# Altium footprint library PCBLIB.PcbLib: 557 footprints (part 27 of 36)
Each footprint in its own frame and in the unit in brackets; x right, y up, seen from the top. Pads: shape width x height; smd on the part's side, far side on the other; paste and mask are expansions set on the pad; w line width, h text height; cw(c..) or ccw(c..) is an arc to the next point about the centre after c.
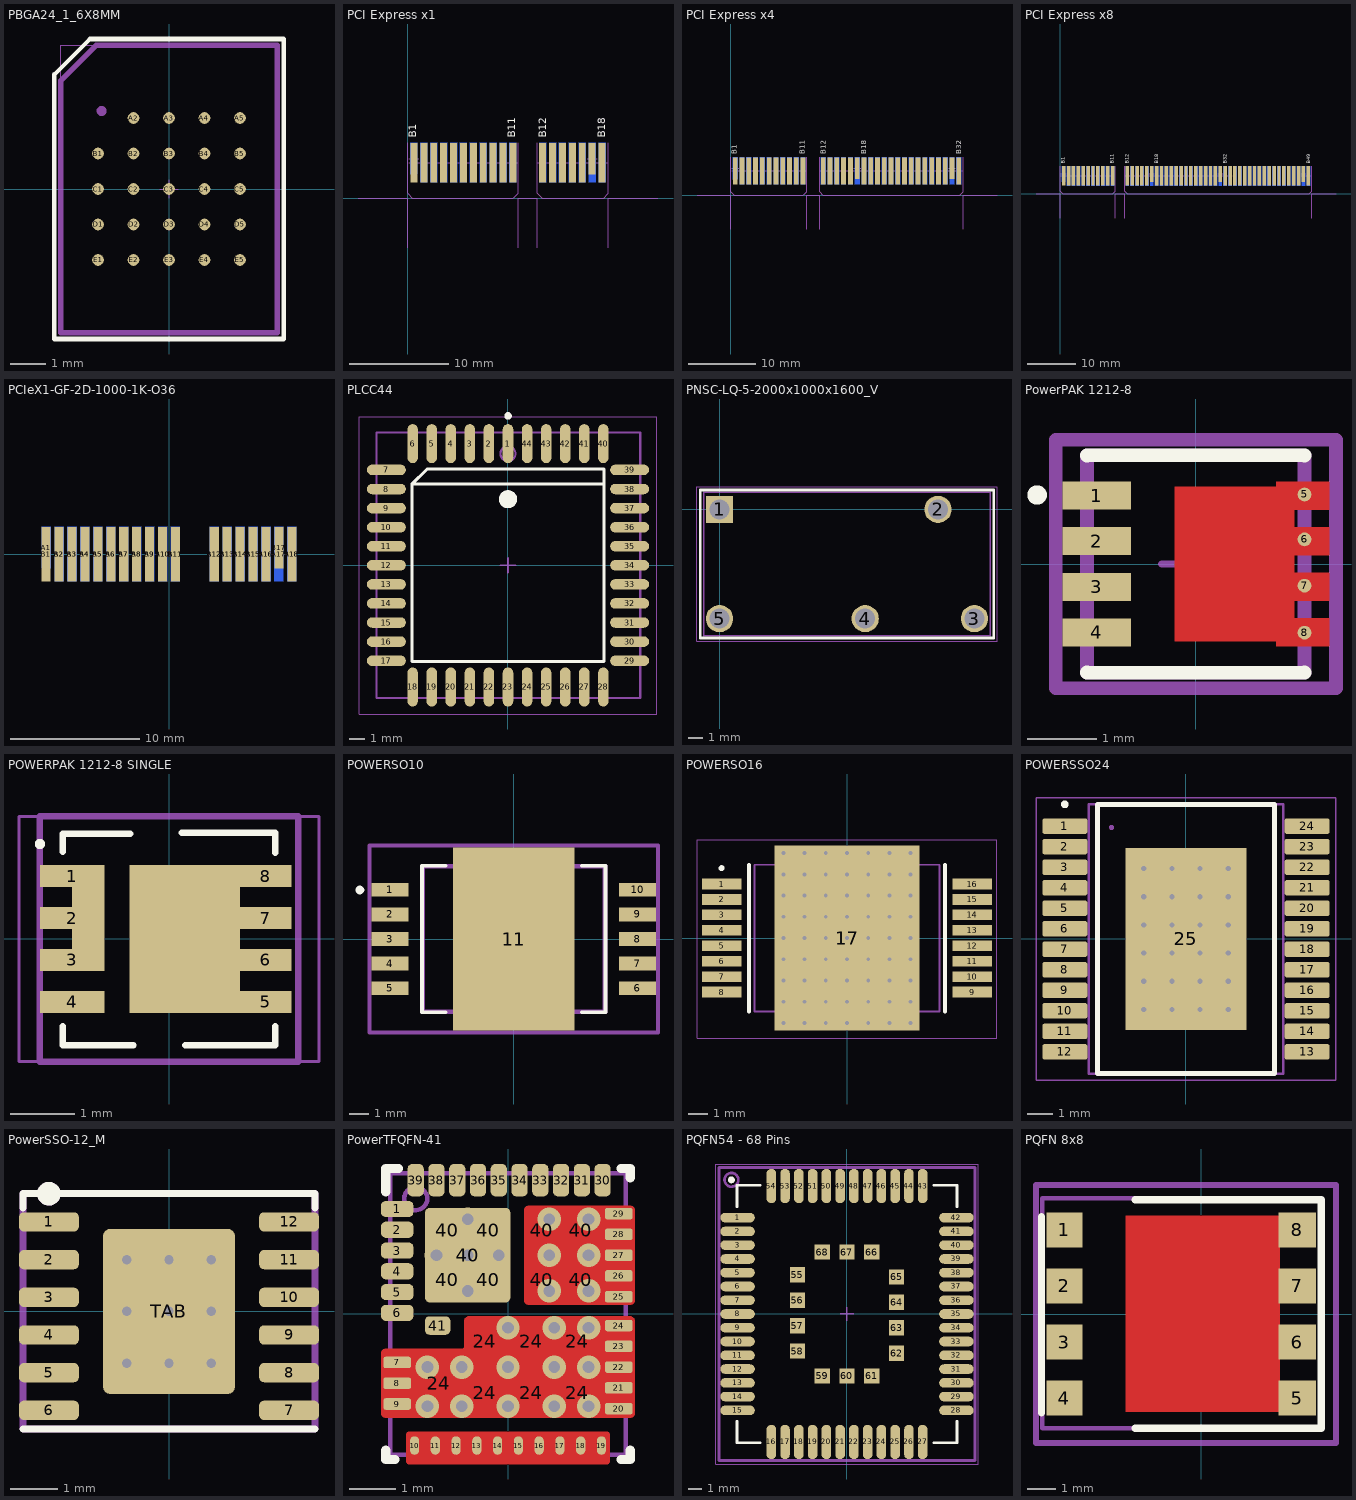
[diagram p26: the footprints below, top view; thin cyan lines are the x and y axes]

## PBGA24_1_6X8MM [mil] "PBGA24_1_6X8MM"
pads (24):
  round 13 smd: A2(-39.37,78.74) A3(0,78.74) A4(39.37,78.74) A5(78.74,78.74) B1(-78.74,39.37) B2(-39.37,39.37) B3(0,39.37) B4(39.37,39.37) B5(78.74,39.37) C1(-78.74,0) C2(-39.37,0) C3(0,0) C4(39.37,0) C5(78.74,0) D1(-78.74,-39.37) D2(-39.37,-39.37) D3(0,-39.37) D4(39.37,-39.37) D5(78.74,-39.37) E1(-78.74,-78.74) E2(-39.37,-78.74) E3(0,-78.74) E4(39.37,-78.74) E5(78.74,-78.74)
Top Overlay:
  lines w5: -127.08,-166.45 -127.08,127.08 -87.71,166.45 127.08,166.45 127.08,-166.45 -127.08,-166.45
Top 3D Body (Mech7):
  lines w1: -120.08,-159.45 120.08,-159.45 120.08,159.45 -120.08,159.45 -120.08,-159.45
Bottom 3D Body (Mech9):
  lines w1: -10,0 10,0 ; 0,-10 0,10
Mechanical 11:
  circle w6: c-74.8,86.61 r2.46
  lines w6: -120.14,-159.45 120.02,-159.45 120.02,159.45 -80.77,159.45 -120.14,120.08 -120.14,-159.45
  text ".Designator" at 32.87,11.25 h20

## PCI Express x1 [mm] "36 contacts Board Eddge PCI Express x1 Connector"
pads (36):
  rect 0.7x3.2 smd far side paste-0.4: A1(0.65,4)
  rect 0.7x4 smd far side paste-0.4: A2(1.65,3.6) A3(2.65,3.6) A4(3.65,3.6) A5(4.65,3.6) A6(5.65,3.6) A7(6.65,3.6) A8(7.65,3.6) A9(8.65,3.6) A10(9.65,3.6) A11(10.65,3.6) A12(13.65,3.6) A13(14.65,3.6) A14(15.65,3.6) A15(16.65,3.6) A16(17.65,3.6) A17(18.65,3.6) A18(19.65,3.6)
  rect 0.7x4 smd paste-0.4: B1(0.65,3.6) B2(1.65,3.6) B3(2.65,3.6) B4(3.65,3.6) B5(4.65,3.6) B6(5.65,3.6) B7(6.65,3.6) B8(7.65,3.6) B9(8.65,3.6) B10(9.65,3.6) B11(10.65,3.6) B12(13.65,3.6) B13(14.65,3.6) B14(15.65,3.6) B15(16.65,3.6) B16(17.65,3.6) B18(19.65,3.6)
  rect 0.7x3.2 smd paste-0.4: B17(18.65,4)
Top Overlay:
  text "B1" at 0.889,6.096 h0.76
  text "B11" at 10.889,6.096 h0.76
  text "B12" at 13.989,6.096 h0.76
  text "B18" at 19.989,6.096 h0.76
Bottom Overlay:
  text "A1" at 0.051,6.02 h0.76
  text "A11" at 10.051,6.02 h0.76
  text "A12" at 13.151,6.02 h0.76
  text "A18" at 19.151,6.02 h0.76
Mechanical 8:
  drawing of 164 lines, arcs and shapes, not listed

## PCI Express x4 [mm] "64 contacts Board Eddge PCI Express x4 Connector"
pads (64):
  rect 0.7x3.2 smd far side paste-0.4: A1(0.65,4)
  rect 0.7x4 smd far side paste-0.4: A2(1.65,3.6) A3(2.65,3.6) A4(3.65,3.6) A5(4.65,3.6) A6(5.65,3.6) A7(6.65,3.6) A8(7.65,3.6) A9(8.65,3.6) A10(9.65,3.6) A11(10.65,3.6) A12(13.65,3.6) A13(14.65,3.6) A14(15.65,3.6) A15(16.65,3.6) A16(17.65,3.6) A17(18.65,3.6) A18(19.65,3.6) A19(20.65,3.6) A20(21.65,3.6) A21(22.65,3.6) A22(23.65,3.601) A23(24.65,3.601) A24(25.65,3.601) A25(26.65,3.601) A26(27.65,3.601) A27(28.65,3.601) A28(29.65,3.601) A29(30.65,3.602) A30(31.65,3.602) A31(32.65,3.602) A32(33.65,3.602)
  rect 0.7x4 smd paste-0.4: B1(0.65,3.6) B2(1.65,3.6) B3(2.65,3.6) B4(3.65,3.6) B5(4.65,3.6) B6(5.65,3.6) B7(6.65,3.6) B8(7.65,3.6) B9(8.65,3.6) B10(9.65,3.6) B11(10.65,3.6) B12(13.65,3.6) B13(14.65,3.6) B14(15.65,3.6) B15(16.65,3.6) B16(17.65,3.6) B18(19.65,3.6) B19(20.65,3.6) B20(21.65,3.6) B21(22.65,3.6) B22(23.65,3.601) B23(24.65,3.601) B24(25.65,3.601) B25(26.65,3.601) B26(27.65,3.601) B27(28.65,3.601) B28(29.65,3.601) B29(30.65,3.602) B30(31.65,3.602) B32(33.65,3.602)
  rect 0.7x3.2 smd paste-0.4: B17(18.65,4) B31(32.65,4.002)
Top Overlay:
  text "B32" at 33.989,6.098 h0.76
  text "B18" at 19.989,6.096 h0.76
  text "B12" at 13.989,6.096 h0.76
  text "B11" at 10.889,6.096 h0.76
  text "B1" at 0.889,6.096 h0.76
Bottom Overlay:
  text "A32" at 33.151,6.022 h0.76
  text "A18" at 19.151,6.02 h0.76
  text "A12" at 13.151,6.02 h0.76
  text "A11" at 10.051,6.02 h0.76
  text "A1" at 0.051,6.02 h0.76
Mechanical 8:
  drawing of 280 lines, arcs and shapes, not listed

## PCI Express x8 [mm] "98 contacts Board Eddge PCI Express x8 Connector"
pads (98):
  rect 0.7x3.2 smd far side paste-0.4: A1(0.65,4)
  rect 0.7x4 smd far side paste-0.4: A2(1.65,3.6) A3(2.65,3.6) A4(3.65,3.6) A5(4.65,3.6) A6(5.65,3.6) A7(6.65,3.6) A8(7.65,3.6) A9(8.65,3.6) A10(9.65,3.6) A11(10.65,3.6) A12(13.65,3.6) A13(14.65,3.6) A14(15.65,3.6) A15(16.65,3.6) A16(17.65,3.6) A17(18.65,3.6) A18(19.65,3.6) A19(20.65,3.6) A20(21.65,3.6) A21(22.65,3.6) A22(23.65,3.601) A23(24.65,3.601) A24(25.65,3.601) A25(26.65,3.601) A26(27.65,3.601) A27(28.65,3.601) A28(29.65,3.601) A29(30.65,3.602) A30(31.65,3.602) A31(32.65,3.602) A32(33.65,3.602) A33(34.65,3.602) A34(35.65,3.602) A35(36.65,3.602) A36(37.65,3.602) A37(38.65,3.602) A38(39.65,3.602) A39(40.65,3.602) A40(41.65,3.602) A41(42.65,3.602) A42(43.65,3.602) A43(44.65,3.602) A44(45.65,3.602) A45(46.65,3.602) A46(47.65,3.602) A47(48.65,3.602) A48(49.65,3.602) A49(50.65,3.602)
  rect 0.7x4 smd paste-0.4: B1(0.65,3.6) B2(1.65,3.6) B3(2.65,3.6) B4(3.65,3.6) B5(4.65,3.6) B6(5.65,3.6) B7(6.65,3.6) B8(7.65,3.6) B9(8.65,3.6) B10(9.65,3.6) B11(10.65,3.6) B12(13.65,3.6) B13(14.65,3.6) B14(15.65,3.6) B15(16.65,3.6) B16(17.65,3.6) B18(19.65,3.6) B19(20.65,3.6) B20(21.65,3.6) B21(22.65,3.6) B22(23.65,3.601) B23(24.65,3.601) B24(25.65,3.601) B25(26.65,3.601) B26(27.65,3.601) B27(28.65,3.601) B28(29.65,3.601) B29(30.65,3.602) B30(31.65,3.602) B32(33.65,3.602) B33(34.65,3.602) B34(35.65,3.602) B35(36.65,3.602) B36(37.65,3.602) B37(38.65,3.602) B38(39.65,3.602) B39(40.65,3.602) B40(41.65,3.602) B41(42.65,3.602) B42(43.65,3.602) B43(44.65,3.602) B44(45.65,3.602) B45(46.65,3.602) B46(47.65,3.602) B47(48.65,3.602) B49(50.65,3.602)
  rect 0.7x3.2 smd paste-0.4: B17(18.65,4) B31(32.65,4.002) B48(49.65,4.002)
Top Overlay:
  text "B49" at 50.989,6.098 h0.76
  text "B32" at 33.989,6.098 h0.76
  text "B18" at 19.989,6.096 h0.76
  text "B12" at 13.989,6.096 h0.76
  text "B11" at 10.889,6.096 h0.76
  text "B1" at 0.889,6.096 h0.76
Bottom Overlay:
  text "A49" at 50.151,6.022 h0.76
  text "A32" at 33.151,6.022 h0.76
  text "A18" at 19.151,6.02 h0.76
  text "A12" at 13.151,6.02 h0.76
  text "A11" at 10.051,6.02 h0.76
  text "A1" at 0.051,6.02 h0.76
Mechanical 8:
  drawing of 308 lines, arcs and shapes, not listed

## PCIeX1-GF-2D-1000-1K-O36 [mm] "Golden finger, PCIeX1, Dual, Opposite, Pitch 1mm, 36-Position"
pads (36):
  rect 0.7x3.2 smd far side paste-1: A1(-9.5,0.5)
  rect 0.7x4.2 smd far side paste-1: A2(-8.5,0) A3(-7.5,0) A4(-6.5,0) A5(-5.5,0) A6(-4.5,0) A7(-3.5,0) A8(-2.5,0) A9(-1.5,0) A10(-0.5,0) A11(0.5,0) A12(3.5,0) A13(4.5,0) A14(5.5,0) A15(6.5,0) A16(7.5,0) A17(8.5,0) A18(9.5,0)
  rect 0.7x4.2 smd paste-1: B1(-9.5,0) B2(-8.5,0) B3(-7.5,0) B4(-6.5,0) B5(-5.5,0) B6(-4.5,0) B7(-3.5,0) B8(-2.5,0) B9(-1.5,0) B10(-0.5,0) B11(0.5,0) B12(3.5,0) B13(4.5,0) B14(5.5,0) B15(6.5,0) B16(7.5,0) B18(9.5,0)
  rect 0.7x3.2 smd paste-1: B17(8.5,0.5)
Top Solder:
  rectangle: -10.4,-3.75 10.4,2.225
Bottom Solder:
  rectangle: -10.4,-3.75 10.4,2.225

## PLCC44 [mm] "Leaded Chip Carrier, 44-Leads, Body 16.6x16.6mm, Pitch 1.27mm, IPC Low Density"
height 4.58
pads (44):
  oval 0.7x2.6 smd: 1(0,8.1) 2(-1.27,8.1) 3(-2.54,8.1) 4(-3.81,8.1) 5(-5.08,8.1) 6(-6.35,8.1) 18(-6.35,-8.1) 19(-5.08,-8.1) 20(-3.81,-8.1) 21(-2.54,-8.1) 22(-1.27,-8.1) 23(0,-8.1) 24(1.27,-8.1) 25(2.54,-8.1) 26(3.81,-8.1) 27(5.08,-8.1) 28(6.35,-8.1) 40(6.35,8.1) 41(5.08,8.1) 42(3.81,8.1) 43(2.54,8.1) 44(1.27,8.1)
  oval 2.6x0.7 smd: 7(-8.1,6.35) 8(-8.1,5.08) 9(-8.1,3.81) 10(-8.1,2.54) 11(-8.1,1.27) 12(-8.1,0) 13(-8.1,-1.27) 14(-8.1,-2.54) 15(-8.1,-3.81) 16(-8.1,-5.08) 17(-8.1,-6.35) 29(8.1,-6.35) 30(8.1,-5.08) 31(8.1,-3.81) 32(8.1,-2.54) 33(8.1,-1.27) 34(8.1,0) 35(8.1,1.27) 36(8.1,2.54) 37(8.1,3.81) 38(8.1,5.08) 39(8.1,6.35)
Top Overlay:
  circle w0.6: c0,4.4 r0.3
  circle w0.25: c0,9.95 r0.125
  lines w0.2: 6.4,5.4 -6.4,5.4 ; -6.4,5.4 -6.4,-6.4 6.4,-6.4 6.4,6.4 -5.4,6.4 -6.4,5.4
Mechanical 15:
  lines w0.05: -9.9,-9.9 9.9,-9.9 9.9,9.9 -9.9,9.9 -9.9,-9.9
  lines w0.1: -0.5,0 0.5,0 ; 0,-0.5 0,0.5
ASM Top:
  circle w0.15: c0,7.43 r0.5
  lines w0.15: -8.763,-8.839 -8.763,8.839 8.814,8.839 8.814,-8.839 -8.763,-8.839
  text ".designator" at -0.388,0 h0.8
3D body "User Library-PLCC44-1.step": height 4.3, standoff -0.04, extent -8.8,-8.8 8.8,8.8

## PNSC-LQ-5-2000x1000x1600_V [mm] "LQ, 5-Leads, Body 20x10mm"
height 16.6
pads (5):
  rect 1.9x1.9 hole 1.4: 1(0,0)
  round 1.9 hole 1.4: 2(15.24,0) 3(17.78,-7.62) 4(10.16,-7.62) 5(0,-7.62)
Top Overlay:
  lines w0.2: -1.35,-8.97 -1.35,1.35 19.13,1.35 19.13,-8.97 -1.35,-8.97
Mechanical 15:
  lines w0.05: -1.575,-9.195 -1.575,1.575 19.355,1.575 19.355,-9.195 -1.575,-9.195
ASM Top:
  lines w0.1: -1.11,-8.81 -1.11,1.19 18.89,1.19 18.89,-8.81 -1.11,-8.81
  text ".designator" at 8.18,-3.77 h0.8
3D body: height 16.6, standoff 0.6, extent -1.11,-8.81 18.89,1.19

## PowerPAK 1212-8 [mil]
pads (8):
  rect 39x16 smd paste+0 mask+0: 1(-56.5,39) 2(-56.5,13) 3(-56.5,-13) 4(-56.5,-39)
  round 7.87 smd paste+0 mask+0: 5(62.01,39.64) 6(62.01,14.06) 7(62.01,-12.35) 8(62.01,-39.17)
Top Layer:
  region: -12,44 46,44 46,47 76,47 76,31 56,31 56,21 76,21 76,5 56,5 56,-5 76,-5 76,-21 56,-21 56,-31 76,-31 76,-47 46,-47 46,-44 -12,-44
Top Overlay:
  circle w9.84: c-90.55,39.37 r0.61
  lines w7.87: -62.01,-61.76 -62.01,-62.01 62.01,-62.01 62.01,-61.76 ; -62.01,61.76 -62.01,62.01 62.01,62.01 62.01,61.76
Mechanical 15:
  lines w3.94: -19.68,0 19.68,0 ; 0,-19.68 0,19.68
  lines w7.87: -79.94,-70.87 -79.94,70.87 79.94,70.87 79.94,-70.87 -79.94,-70.87
ASM Top:
  lines w7.87: -62.01,-62.01 62.01,-62.01 62.01,62.01 -62.01,62.01 -62.01,-62.01
  text ".Designator" at 0,0 h39.37
3D body "Trans_Vishay_SI7113ADN-T1-GE3_eec.STEP": height 46.14, standoff 0, extent -64.96,-64.96 64.96,64.96

## POWERPAK 1212-8 SINGLE [mm] "TO, 5-Pads, Body 4.63x5.01mm (max), IPC Medium Density"
height 1.04
pads (10):
  rect 1x0.34 smd mask+0.05: 1(-1.5,0.975) 2(-1.5,0.325) 4(-1.5,-0.975)
  rect 1x0.34 smd: 3(-1.5,-0.325)
  rect 0.8x0.34 smd mask+0.05: 5(1.5,-0.975) 6(1.5,-0.325) 7(1.5,0.325) 8(1.5,0.975)
  rect 0.5x1.64 smd mask+0.05: ""(-1.25,0.325)
  rect 1.71x2.29 smd mask+0.05: ""(0.245,0)
Top Overlay:
  circle w0.1: c-2,1.473 r0.03
  lines w0.1: -1.65,-1.35 -1.65,-1.65 -0.55,-1.65 ; -1.65,1.35 -1.65,1.634 -0.6,1.634 ; 0.2,1.65 1.645,1.65 1.645,1.334 ; 0.25,-1.65 1.65,-1.65 1.65,-1.35
Mechanical 15:
  lines w0.05: -2.325,-1.9 2.325,-1.9 2.325,1.9 -2.325,1.9 -2.325,-1.9
  lines w0.1: -0.5,0 0.5,0 ; 0,-0.5 0,0.5
ASM Top:
  lines w0.1: -2,-1.9 -2,1.9 2,1.9 2,-1.9 -2,-1.9
  text ".designator" at -0.3,-0.1 h0.8
3D body "User Library-PowerPAK 1212-8-SiS892DN.step": height 1.05, standoff 0.01, extent -1.65,-1.65 1.65,1.65

## POWERSO10 [mm]
pads (11):
  rect 1.925x0.7 smd paste-0.05 mask+0.05: 1(-6.412,2.54) 2(-6.412,1.27) 3(-6.412,0) 4(-6.412,-1.27) 5(-6.412,-2.54) 6(6.412,-2.54) 7(6.412,-1.27) 8(6.412,0) 9(6.412,1.27) 10(6.412,2.54)
  rect 6.3x9.5 smd paste-10 mask+0.05: 11(0,0)
Top Overlay:
  circle w0.25: c-7.975,2.54 r0.1
  lines w0.2: -3.525,-3.8 -4.75,-3.8 -4.75,3.8 -3.525,3.8 ; 3.525,-3.8 4.75,-3.8 4.75,3.8 3.525,3.8
Top Paste:
  rectangle: -3,-4.6 -1.2,-2.8
  region: 3,-2.8 1.2,-2.8 1.2,-4.6 3,-4.6
  region: 0.9,-2.8 -0.9,-2.8 -0.9,-4.6 0.9,-4.6
  rectangle: -3,-2.1 -1.2,-0.3
  region: 3,-0.3 1.2,-0.3 1.2,-2.1 3,-2.1
  region: 0.9,-0.3 -0.9,-0.3 -0.9,-2.1 0.9,-2.1
  rectangle: -3,0.4 -1.2,2.2
  region: 3,2.2 1.2,2.2 1.2,0.4 3,0.4
  region: 0.9,2.2 -0.9,2.2 -0.9,0.4 0.9,0.4
  region: 0.9,4.7 -0.9,4.7 -0.9,2.9 0.9,2.9
  region: 3,4.7 1.2,4.7 1.2,2.9 3,2.9
  rectangle: -3,2.9 -1.2,4.7
Mechanical 15:
  lines w0.2: -7.475,-4.85 -7.475,4.85 7.475,4.85 7.475,-4.85 -7.475,-4.85
Mechanical 16:
  lines w0.1: -0.5,0 0.5,0 ; 0,-0.5 0,0.5
ASM Top:
  lines w0.2: -4.75,-3.8 -4.75,3.8 4.75,3.8 4.75,-3.8 -4.75,-3.8 ; -4.7,-3.75 -4.7,3.75 4.7,3.75 4.7,-3.75 -4.7,-3.75
  text ".designator" at 0,0.188 h0.8
3D body "IC_STMicroelectronics_VN340SP-E_eec.STEP": height 3.7, standoff 0, extent -7.089,-4.75 7.089,4.75

## POWERSO16 [mm] "SOP, 16-Leads, Body 7.50x9.45mm, Pitch 0.80mm, Thermal Pad 9.60x7.50mm, IPC Medium Density"
height 3.6
pads (17):
  rect 2.05x0.55 smd mask+0.05: 1(-6.5,2.8) 2(-6.5,2) 3(-6.5,1.2) 4(-6.5,0.4) 5(-6.5,-0.4) 6(-6.5,-1.2) 7(-6.5,-2) 8(-6.5,-2.8) 9(6.5,-2.8) 10(6.5,-2) 11(6.5,-1.2) 12(6.5,-0.4) 13(6.5,0.4) 14(6.5,1.2) 15(6.5,2) 16(6.5,2.8)
  rect 7.5x9.6 smd paste-10 mask+0.05: 17(0,0)
via 3.3,-4.4 diameter 0.5 hole 0.2
via 2.2,-4.4 diameter 0.5 hole 0.2
via 1.1,-4.4 diameter 0.5 hole 0.2
via 0,-4.4 diameter 0.5 hole 0.2
via -1.1,-4.4 diameter 0.5 hole 0.2
via -2.2,-4.4 diameter 0.5 hole 0.2
via -3.3,-4.4 diameter 0.5 hole 0.2
via 3.3,-3.3 diameter 0.5 hole 0.2
via 2.2,-3.3 diameter 0.5 hole 0.2
via 1.1,-3.3 diameter 0.5 hole 0.2
via 0,-3.3 diameter 0.5 hole 0.2
via -1.1,-3.3 diameter 0.5 hole 0.2
via -2.2,-3.3 diameter 0.5 hole 0.2
via -3.3,-3.3 diameter 0.5 hole 0.2
via 3.3,-2.2 diameter 0.5 hole 0.2
via 2.2,-2.2 diameter 0.5 hole 0.2
via 1.1,-2.2 diameter 0.5 hole 0.2
via 0,-2.2 diameter 0.5 hole 0.2
via -1.1,-2.2 diameter 0.5 hole 0.2
via -2.2,-2.2 diameter 0.5 hole 0.2
via -3.3,-2.2 diameter 0.5 hole 0.2
via 3.3,-1.1 diameter 0.5 hole 0.2
via 2.2,-1.1 diameter 0.5 hole 0.2
via 1.1,-1.1 diameter 0.5 hole 0.2
via 0,-1.1 diameter 0.5 hole 0.2
via -1.1,-1.1 diameter 0.5 hole 0.2
via -2.2,-1.1 diameter 0.5 hole 0.2
via -3.3,-1.1 diameter 0.5 hole 0.2
via 3.3,0 diameter 0.5 hole 0.2
via 2.2,0 diameter 0.5 hole 0.2
via 1.1,0 diameter 0.5 hole 0.2
via 0,0 diameter 0.5 hole 0.2
via -1.1,0 diameter 0.5 hole 0.2
via -2.2,0 diameter 0.5 hole 0.2
via -3.3,0 diameter 0.5 hole 0.2
via 3.3,1.1 diameter 0.5 hole 0.2
via 2.2,1.1 diameter 0.5 hole 0.2
via 1.1,1.1 diameter 0.5 hole 0.2
via 0,1.1 diameter 0.5 hole 0.2
via -1.1,1.1 diameter 0.5 hole 0.2
via -2.2,1.1 diameter 0.5 hole 0.2
via -3.3,1.1 diameter 0.5 hole 0.2
via 3.3,2.2 diameter 0.5 hole 0.2
via 2.2,2.2 diameter 0.5 hole 0.2
via 1.1,2.2 diameter 0.5 hole 0.2
via 0,2.2 diameter 0.5 hole 0.2
via -1.1,2.2 diameter 0.5 hole 0.2
via -2.2,2.2 diameter 0.5 hole 0.2
via -3.3,2.2 diameter 0.5 hole 0.2
via 3.3,3.3 diameter 0.5 hole 0.2
via 2.2,3.3 diameter 0.5 hole 0.2
via 1.1,3.3 diameter 0.5 hole 0.2
via 0,3.3 diameter 0.5 hole 0.2
via -1.1,3.3 diameter 0.5 hole 0.2
via -2.2,3.3 diameter 0.5 hole 0.2
via -3.3,3.3 diameter 0.5 hole 0.2
via 3.3,4.4 diameter 0.5 hole 0.2
via 2.2,4.4 diameter 0.5 hole 0.2
via 1.1,4.4 diameter 0.5 hole 0.2
via 0,4.4 diameter 0.5 hole 0.2
via -1.1,4.4 diameter 0.5 hole 0.2
via -2.2,4.4 diameter 0.5 hole 0.2
via -3.3,4.4 diameter 0.5 hole 0.2
Top Overlay:
  circle w0.2: c-6.5,3.625 r0.05
  lines w0.2: -5.075,-3.8 -5.075,3.8 ; 5.075,-3.8 5.075,3.8
Top Paste:
  rectangle: -3.1,3.5 -2.4,4.2
  rectangle: -2,3.5 -1.3,4.2
  rectangle: -0.9,3.5 -0.2,4.2
  rectangle: 0.2,3.5 0.9,4.2
  rectangle: 1.3,3.5 2,4.2
  rectangle: 2.4,3.5 3.1,4.2
  rectangle: 2.4,2.4 3.1,3.1
  rectangle: 1.3,2.4 2,3.1
  rectangle: 0.2,2.4 0.9,3.1
  rectangle: -0.9,2.4 -0.2,3.1
  rectangle: -2,2.4 -1.3,3.1
  rectangle: -3.1,2.4 -2.4,3.1
  rectangle: 2.4,1.3 3.1,2
  rectangle: 1.3,1.3 2,2
  rectangle: 0.2,1.3 0.9,2
  rectangle: -0.9,1.3 -0.2,2
  rectangle: -2,1.3 -1.3,2
  rectangle: -3.1,1.3 -2.4,2
  rectangle: -3.1,-2 -2.4,-1.3
  rectangle: -2,-2 -1.3,-1.3
  rectangle: -0.9,-2 -0.2,-1.3
  rectangle: 0.2,-2 0.9,-1.3
  rectangle: 1.3,-2 2,-1.3
  rectangle: 2.4,-2 3.1,-1.3
  rectangle: -3.1,-0.9 -2.4,-0.2
  rectangle: -2,-0.9 -1.3,-0.2
  rectangle: -0.9,-0.9 -0.2,-0.2
  rectangle: 0.2,-0.9 0.9,-0.2
  rectangle: 1.3,-0.9 2,-0.2
  rectangle: 2.4,-0.9 3.1,-0.2
  rectangle: 2.4,0.2 3.1,0.9
  rectangle: 1.3,0.2 2,0.9
  rectangle: 0.2,0.2 0.9,0.9
  rectangle: -0.9,0.2 -0.2,0.9
  rectangle: -2,0.2 -1.3,0.9
  rectangle: -3.1,0.2 -2.4,0.9
  rectangle: 2.4,-3.1 3.1,-2.4
  rectangle: 1.3,-3.1 2,-2.4
  rectangle: 0.2,-3.1 0.9,-2.4
  rectangle: -0.9,-3.1 -0.2,-2.4
  rectangle: -2,-3.1 -1.3,-2.4
  rectangle: -3.1,-3.1 -2.4,-2.4
  rectangle: 2.4,-4.2 3.1,-3.5
  rectangle: 1.3,-4.2 2,-3.5
  rectangle: 0.2,-4.2 0.9,-3.5
  rectangle: -0.9,-4.2 -0.2,-3.5
  rectangle: -2,-4.2 -1.3,-3.5
  rectangle: -3.1,-4.2 -2.4,-3.5
Mechanical 15:
  lines w0.05: -7.775,-5.2 7.775,-5.2 7.775,5.1 -7.775,5.1 -7.775,-5.2
  lines w0.1: -0.5,0 0.5,0 ; 0,-0.5 0,0.5
ASM Top:
  lines w0.1: -4.8,-3.8 4.8,-3.8 4.8,3.8 -4.8,3.8 -4.8,-3.8
  text ".designator" at -0.344,0 h0.8
3D body "VND5T016ASPTR-E.stp": height 3.6, standoff 0, extent -7.05,-4.75 7.05,4.75

## POWERSSO24 [mm] "SOP, 24-Leads, Body 10.30x7.50mm, Pitch 0.80mm, Thermal Pad 7.10x4.70mm, IPC Medium Density"
height 2.45
pads (25):
  rrect25% 1.75x0.6 smd paste-0.05 mask+0.05: 1(-4.725,4.4) 2(-4.725,3.6) 3(-4.725,2.8) 4(-4.725,2) 5(-4.725,1.2) 6(-4.725,0.4) 7(-4.725,-0.4) 8(-4.725,-1.2) 9(-4.725,-2) 10(-4.725,-2.8) 11(-4.725,-3.6) 12(-4.725,-4.4) 13(4.725,-4.4) 14(4.725,-3.6) 15(4.725,-2.8) 16(4.725,-2) 17(4.725,-1.2) 18(4.725,-0.4) 19(4.725,0.4) 20(4.725,1.2) 21(4.725,2) 22(4.725,2.8) 23(4.725,3.6) 24(4.725,4.4)
  rect 4.7x7.1 smd paste-10 mask+0.05: 25(0,0)
via 1.65,-2.75 diameter 0.5 hole 0.2
via 0.55,-2.75 diameter 0.5 hole 0.2
via -0.55,-2.75 diameter 0.5 hole 0.2
via -1.65,-2.75 diameter 0.5 hole 0.2
via 1.65,-1.65 diameter 0.5 hole 0.2
via 0.55,-1.65 diameter 0.5 hole 0.2
via -0.55,-1.65 diameter 0.5 hole 0.2
via -1.65,-1.65 diameter 0.5 hole 0.2
via 1.65,-0.55 diameter 0.5 hole 0.2
via 0.55,-0.55 diameter 0.5 hole 0.2
via -0.55,-0.55 diameter 0.5 hole 0.2
via -1.65,-0.55 diameter 0.5 hole 0.2
via 1.65,0.55 diameter 0.5 hole 0.2
via 0.55,0.55 diameter 0.5 hole 0.2
via -0.55,0.55 diameter 0.5 hole 0.2
via -1.65,0.55 diameter 0.5 hole 0.2
via 1.65,1.65 diameter 0.5 hole 0.2
via 0.55,1.65 diameter 0.5 hole 0.2
via -0.55,1.65 diameter 0.5 hole 0.2
via -1.65,1.65 diameter 0.5 hole 0.2
via 1.65,2.75 diameter 0.5 hole 0.2
via 0.55,2.75 diameter 0.5 hole 0.2
via -0.55,2.75 diameter 0.5 hole 0.2
via -1.65,2.75 diameter 0.5 hole 0.2
Top Overlay:
  circle w0.25: c-4.725,5.25 r0.025
  lines w0.2: -3.45,-5.25 3.45,-5.25 3.45,5.25 -3.45,5.25 -3.45,-5.25
Top Paste:
  region: -1.9,-2.6 -1.9,-1.9 -2.3,-1.9 -2.3,-2.6
  region: 2.3,-2.6 2.3,-1.9 1.9,-1.9 1.9,-2.6
  rectangle: -0.4,-3.4 0.3,-3
  rectangle: 0.7,-3.4 1.4,-3
  rectangle: -1.5,-3.4 -0.8,-3
  region: -2.3,-0.75 -2.3,-1.45 -1.9,-1.45 -1.9,-0.75
  region: -2.3,0.35 -2.3,-0.35 -1.9,-0.35 -1.9,0.35
  region: -2.3,1.45 -2.3,0.75 -1.9,0.75 -1.9,1.45
  region: -2.3,2.55 -2.3,1.85 -1.9,1.85 -1.9,2.55
  region: -2.3,2.55 -2.3,1.85 -1.9,1.85 -1.9,2.55
  region: 1.9,-0.75 1.9,-1.45 2.3,-1.45 2.3,-0.75
  region: 1.9,0.35 1.9,-0.35 2.3,-0.35 2.3,0.35
  region: 1.9,2.55 1.9,1.85 2.3,1.85 2.3,2.55
  region: 1.9,1.45 1.9,0.75 2.3,0.75 2.3,1.45
  rectangle: -1.5,3 -0.8,3.4
  rectangle: 0.7,3 1.4,3.4
  rectangle: -0.4,3 0.3,3.4
  rectangle: -1.5,-2.5 -0.8,-1.9
  rectangle: -0.4,-2.5 0.3,-1.9
  rectangle: 0.7,-2.5 1.4,-1.9
  rectangle: -1.5,-1.4 -0.8,-0.8
  rectangle: -0.4,-1.4 0.3,-0.8
  rectangle: 0.7,-1.4 1.4,-0.8
  rectangle: -1.5,-0.3 -0.8,0.3
  rectangle: -0.4,-0.3 0.3,0.3
  rectangle: 0.7,-0.3 1.4,0.3
  rectangle: -1.5,0.8 -0.8,1.4
  rectangle: -0.4,0.8 0.3,1.4
  rectangle: 0.7,0.8 1.4,1.4
  rectangle: 0.7,1.9 1.4,2.5
  rectangle: -0.4,1.9 0.3,2.5
  rectangle: -1.5,1.9 -0.8,2.5
Mechanical 15:
  lines w0.05: -5.85,-5.5 5.85,-5.5 5.85,5.5 -5.85,5.5 -5.85,-5.5
  lines w0.1: -0.5,0 0.5,0 ; 0,-0.5 0,0.5
ASM Top:
  circle w0.1: c-2.9,4.35 r0.05
  lines w0.1: -3.8,-5.25 -3.8,5.25 3.8,5.25 3.8,-5.25 -3.8,-5.25
3D body: height 2.45, standoff 0.1, extent -3.8,-5.25 3.8,5.25

## PowerSSO-12_M [mm] "SOP, 10-Leads, Body 7.5x9.4mm, Pitch 1.27mm, Thermal Pad, IPC Low Density"
height 3.7
pads (13):
  rrect50% 1.27x0.41 smd mask+0.05: 1(-2.55,1.9) 2(-2.55,1.1) 3(-2.55,0.3) 4(-2.55,-0.5) 5(-2.55,-1.3) 6(-2.55,-2.1) 7(2.55,-2.1) 8(2.55,-1.3) 9(2.55,-0.5) 10(2.55,0.3) 11(2.55,1.1) 12(2.55,1.9)
  rrect10% 2.8x3.5 smd paste-3.15 mask+0.05: TAB(0,0)
via 0,1.1 diameter 0.5 hole 0.2
via 0.9,-1.1 diameter 0.5 hole 0.2
via 0,-1.1 diameter 0.5 hole 0.2
via -0.9,-1.1 diameter 0.5 hole 0.2
via 0.9,1.1 diameter 0.5 hole 0.2
via -0.9,1.1 diameter 0.5 hole 0.2
via -0.9,0 diameter 0.5 hole 0.2
via 0.9,0 diameter 0.5 hole 0.2
via 0,0 diameter 0.5 hole 0.2
Top Overlay:
  circle w0.25: c-2.55,2.5 r0.125
  lines w0.15: -3.1,-2.5 3.1,-2.5 ; -3.1,2.2 -3.1,2.5 ; -2,2.5 -3.1,2.5 ; -2,2.5 3.1,2.5 3.1,2.5 3.1,2.2 ; -3.1,2.5 -3.1,2.5
Top Paste:
  rectangle: 0.15,0.55 1.1,1.5
  region: -0.15,0.55 -0.15,1.5 -1.1,1.5 -1.1,0.55
  region: -0.15,-1.55 -0.15,-0.6 -1.1,-0.6 -1.1,-1.55
  region: 1.1,-1.55 1.1,-0.6 0.15,-0.6 0.15,-1.55
ASM Top:
  circle w0.25: c-2.55,2.5 r0.125
  lines w0.15: -3.1,-2.5 3.1,-2.5 3.1,2.5 ; -3.1,-2.5 -3.1,-2.5 ; -3.1,-2.5 -3.1,2.5 3.1,2.5 ; 3.1,2.5 3.1,2.5
  text ".designator" at 0,0 h0.8
3D body "User Library-ST_MICRO_PowerSSO-12.step": height 1.65, standoff 0.01, extent -3.1,-2.5 3.1,2.5

## PowerTFQFN-41 [mm]
pads (56):
  rrect57% 0.7x0.35 smd paste-0.05 mask-0.05: 1(-2.4,2.275) 2(-2.4,1.825) 3(-2.4,1.375) 4(-2.4,0.925) 5(-2.4,0.475) 6(-2.4,0.025)
  rrect40% 0.6x0.25 smd mask+0: 7(-2.4,-1.05) 8(-2.4,-1.5) 9(-2.4,-1.95) 20(2.4,-2.05) 21(2.4,-1.6) 22(2.4,-1.15) 23(2.4,-0.7) 24(2.4,-0.25) 25(2.4,0.375) 26(2.4,0.825) 27(2.4,1.275) 28(2.4,1.725) 29(2.4,2.175)
  rrect100% 0.2x0.4 smd paste-0.4 mask-0.4: 10(-2.025,-2.85) 11(-1.575,-2.85) 12(-1.125,-2.85) 13(-0.675,-2.85) 14(-0.225,-2.85) 15(0.225,-2.85) 16(0.675,-2.85) 17(1.125,-2.85) 18(1.575,-2.85) 19(2.025,-2.85)
  rrect50% 0.8x1.33 on Top Paste: 24(-1.5,-1.505)
  rrect50% 0.8x0.92 on Top Paste: 24(-0.5,-1.71) 24(-0.5,-0.59) 24(0.5,-1.71) 24(0.5,-0.59) 24(1.5,-1.71) 24(1.5,-0.59)
  rrect57% 0.35x0.7 smd paste-0.05 mask-0.05: 30(2.05,2.9) 31(1.6,2.9) 32(1.15,2.9) 33(0.7,2.9) 34(0.25,2.9) 35(-0.2,2.9) 36(-0.65,2.9) 37(-1.1,2.9) 38(-1.55,2.9) 39(-2,2.9)
  rrect50% 0.69x0.87 on Top Paste: 40(-1.32,0.74) 40(-1.32,1.81) 40(-0.43,0.74) 40(-0.43,1.81)
  rrect11% 1.85x2.05 smd paste-2.05 mask-0.05: 40(-0.875,1.275)
  rrect50% 0.63x0.87 on Top Paste: 40(0.735,0.74) 40(0.735,1.81) 40(1.575,0.74) 40(1.575,1.81)
  rrect50% 0.55x0.4 smd paste-0.05 mask-0.05: 41(-1.525,-0.25)
via -0.875,2.05 diameter 0.508 hole 0.254
via -0.875,1.275 diameter 0.508 hole 0.254
via -1.55,1.275 diameter 0.508 hole 0.254
via -0.875,0.5 diameter 0.508 hole 0.254
via -0.2,1.275 diameter 0.508 hole 0.254
via 0.896,2.05 diameter 0.508 hole 0.254
via 0.896,1.275 diameter 0.508 hole 0.254
via 0.896,0.5 diameter 0.508 hole 0.254
via 1.746,0.5 diameter 0.508 hole 0.254
via 1.746,1.275 diameter 0.508 hole 0.254
via 1.746,2.05 diameter 0.508 hole 0.254
via 0,-0.3 diameter 0.508 hole 0.254
via 0,-1.15 diameter 0.508 hole 0.254
via 0,-2 diameter 0.508 hole 0.254
via -1.746,-1.15 diameter 0.508 hole 0.254
via -1.746,-2 diameter 0.508 hole 0.254
via -1,-1.15 diameter 0.508 hole 0.254
via -1,-2 diameter 0.508 hole 0.254
via 1,-0.3 diameter 0.508 hole 0.254
via 1,-1.15 diameter 0.508 hole 0.254
via 1,-2 diameter 0.508 hole 0.254
via 1.746,-0.3 diameter 0.508 hole 0.254
via 1.746,-1.15 diameter 0.508 hole 0.254
via 1.746,-2 diameter 0.508 hole 0.254
Top Layer:
  region: -2.2,-3.2 -2.2,-3.21 -2.192,-3.228 -2.178,-3.242 -2.16,-3.25 -2.15,-3.25 2.15,-3.25 2.16,-3.25 2.178,-3.242 2.192,-3.228 2.2,-3.21 2.2,-3.2 2.2,-2.6 2.2,-2.59 2.192,-2.572 2.178,-2.558 2.16,-2.55 2.15,-2.55 -2.15,-2.55 -2.16,-2.55 -2.178,-2.558 -2.192,-2.572 -2.2,-2.59 -2.2,-2.6
  region: -2.75,-2.15 -2.75,-0.85 -2.75,-0.83 -2.735,-0.793 -2.707,-0.765 -2.67,-0.75 -2.65,-0.75 -1,-0.75 -0.99,-0.749 -0.972,-0.742 -0.958,-0.728 -0.951,-0.71 -0.95,-0.7 -0.95,-0.15 -0.95,-0.13 -0.935,-0.093 -0.907,-0.065 -0.87,-0.05 -0.85,-0.05 2.65,-0.05 2.67,-0.05 2.707,-0.065 2.735,-0.093 2.75,-0.13 2.75,-0.15 2.75,-2.15 2.75,-2.17 2.735,-2.207 2.707,-2.235 2.67,-2.25 2.65,-2.25 -2.65,-2.25 -2.67,-2.25 -2.707,-2.235 -2.735,-2.207 -2.75,-2.17
  region: 0.35,0.3 0.35,0.28 0.365,0.243 0.393,0.215 0.43,0.2 0.45,0.2 2.65,0.2 2.67,0.2 2.707,0.215 2.735,0.243 2.75,0.28 2.75,0.3 2.75,2.25 2.75,2.27 2.735,2.307 2.707,2.335 2.67,2.35 2.65,2.35 0.45,2.35 0.43,2.35 0.393,2.335 0.365,2.307 0.35,2.27 0.35,2.25
Top Overlay:
  lines w0.2: -2.65,-2.95 -2.65,-3.15 -2.45,-3.15 ; -2.65,2.65 -2.65,3.15 -2.375,3.15 ; 2.45,-3.15 2.65,-3.15 2.65,-2.95 ; 2.45,3.15 2.65,3.15 2.65,2.95
Top Paste:
  drawing of 1 lines, arcs and shapes, not listed
Top Solder:
  drawing of 3 lines, arcs and shapes, not listed
ASM Top:
  circle w0.1: c-2,2.5 r0.25
  lines w0.1: -2.55,-3.05 2.55,-3.05 2.55,3.05 -2.55,3.05 -2.55,-3.05
  text ".Designator" at 1.778,0.635 h1.85
3D body "RWJ0041A.stp": height 1.04, standoff 0.01, extent -2.5,-3 2.5,3

## PQFN54 - 68 Pins [mm] "PQFN, 54-Leads, Body 18.60x21.30mm, Pitch 1.00mm, IPC Medium Density"
height 3
pads (68):
  oval 2.5x0.7 smd paste-0.05 mask+0.05: 1(-7.95,7) 2(-7.95,6) 3(-7.95,5) 4(-7.95,4) 5(-7.95,3) 6(-7.95,2) 7(-7.95,1) 8(-7.95,0) 9(-7.95,-1) 10(-7.95,-2) 11(-7.95,-3) 12(-7.95,-4) 13(-7.95,-5) 14(-7.95,-6) 15(-7.95,-7) 28(7.95,-7) 29(7.95,-6) 30(7.95,-5) 31(7.95,-4) 32(7.95,-3) 33(7.95,-2) 34(7.95,-1) 35(7.95,0) 36(7.95,1) 37(7.95,2) 38(7.95,3) 39(7.95,4) 40(7.95,5) 41(7.95,6) 42(7.95,7)
  oval 0.7x2.5 smd paste-0.05 mask+0.05: 16(-5.5,-9.3) 17(-4.5,-9.3) 18(-3.5,-9.3) 19(-2.5,-9.3) 20(-1.5,-9.3) 21(-0.5,-9.3) 22(0.5,-9.3) 23(1.5,-9.3) 24(2.5,-9.3) 25(3.5,-9.3) 26(4.5,-9.3) 27(5.5,-9.3) 43(5.5,9.3) 44(4.5,9.3) 45(3.5,9.3) 46(2.5,9.3) 47(1.5,9.3) 48(0.5,9.3) 49(-0.5,9.3) 50(-1.5,9.3) 51(-2.5,9.3) 52(-3.5,9.3) 53(-4.5,9.3) 54(-5.5,9.3)
  rect 1.1x1.1 smd paste-0.05 mask+0.05: 55(-3.6,2.85) 56(-3.6,1) 57(-3.6,-0.85) 58(-3.6,-2.7) 59(-1.8,-4.5) 60(0,-4.5) 61(1.8,-4.5) 62(3.6,-2.85) 63(3.6,-1) 64(3.6,0.85) 65(3.6,2.7) 66(1.8,4.5) 67(0,4.5) 68(-1.8,4.5)
Top Overlay:
  circle w0.25: c-8.4,9.75 r0.125
  lines w0.2: -8.001,-7.8 -8.001,-9.351 -6.3,-9.351 ; -8.001,7.8 -8.001,9.351 -6.3,9.351 ; 6.3,-9.351 8.001,-9.351 8.001,-7.8 ; 6.3,9.351 8.001,9.351 8.001,7.8
Mechanical 15:
  lines w0.05: -9.55,-10.9 9.55,-10.9 9.55,10.9 -9.55,10.9 -9.55,-10.9
  lines w0.1: -0.5,0 0.5,0 ; 0,-0.5 0,0.5
ASM Top:
  circle w0.2: c-8.4,9.75 r0.5
  lines w0.2: -9.3,-10.65 -9.3,10.65 9.3,10.65 9.3,-10.65 -9.3,-10.65
  text ".designator" at -1.5,-0.3 h0.8
3D body "User Library-Quectel MC60.step": height 2.11, standoff 0.01, extent -8.001,-9.351 8.001,9.351

## PQFN 8x8 [mm]
pads (8):
  rect 1.28x1.25 smd mask+0: 1(-4.89,3) 2(-4.89,1) 3(-4.89,-1) 4(-4.89,-3)
  rect 1.33x1.25 smd mask+0: 5(3.415,-3) 6(3.415,-1) 7(3.415,1) 8(3.415,3)
Top Layer:
  rectangle: -2.7,-3.49 2.8,3.51
Top Overlay:
  lines w0.254: -5.7,-3.525 -5.7,3.475 ; -2.375,-4.075 4.275,-4.075 ; -2.375,4.075 4.275,4.075 ; 4.275,-4.05 4.275,4.05
Top Paste:
  rectangle: 1.075,-3.2 2.55,-1.375
  rectangle: -0.725,-3.2 0.75,-1.375
  rectangle: -2.525,-3.2 -1.05,-1.375
  rectangle: 1.075,-0.913 2.55,0.913
  rectangle: -0.725,-0.913 0.75,0.913
  rectangle: -2.525,-0.913 -1.05,0.913
  rectangle: 1.075,1.4 2.55,3.225
  rectangle: -0.725,1.4 0.75,3.225
  rectangle: -2.525,1.4 -1.05,3.225
Mechanical 15:
  lines w0.2: -5.9,-4.6 -5.9,4.6 4.8,4.6 4.8,-4.6 -5.9,-4.6
ASM Top:
  lines w0.15: -5.675,-4.075 4.2,-4.075 4.225,-4.05 4.225,4.125 -5.675,4.125 -5.675,-4.075
  text ".designator" at 0,0 h1.2
3D body: height 2, standoff 0, extent -5.328,-4.075 3.629,4.125